# Altium footprint library mastermind.PCBLIB: 1061 footprints (part 46 of 67)
Each footprint in its own frame and in the unit in brackets; x right, y up, seen from the top. Pads: shape width x height; smd on the part's side, far side on the other; paste and mask are expansions set on the pad; w line width, h text height; cw(c..) or ccw(c..) is an arc to the next point about the centre after c.
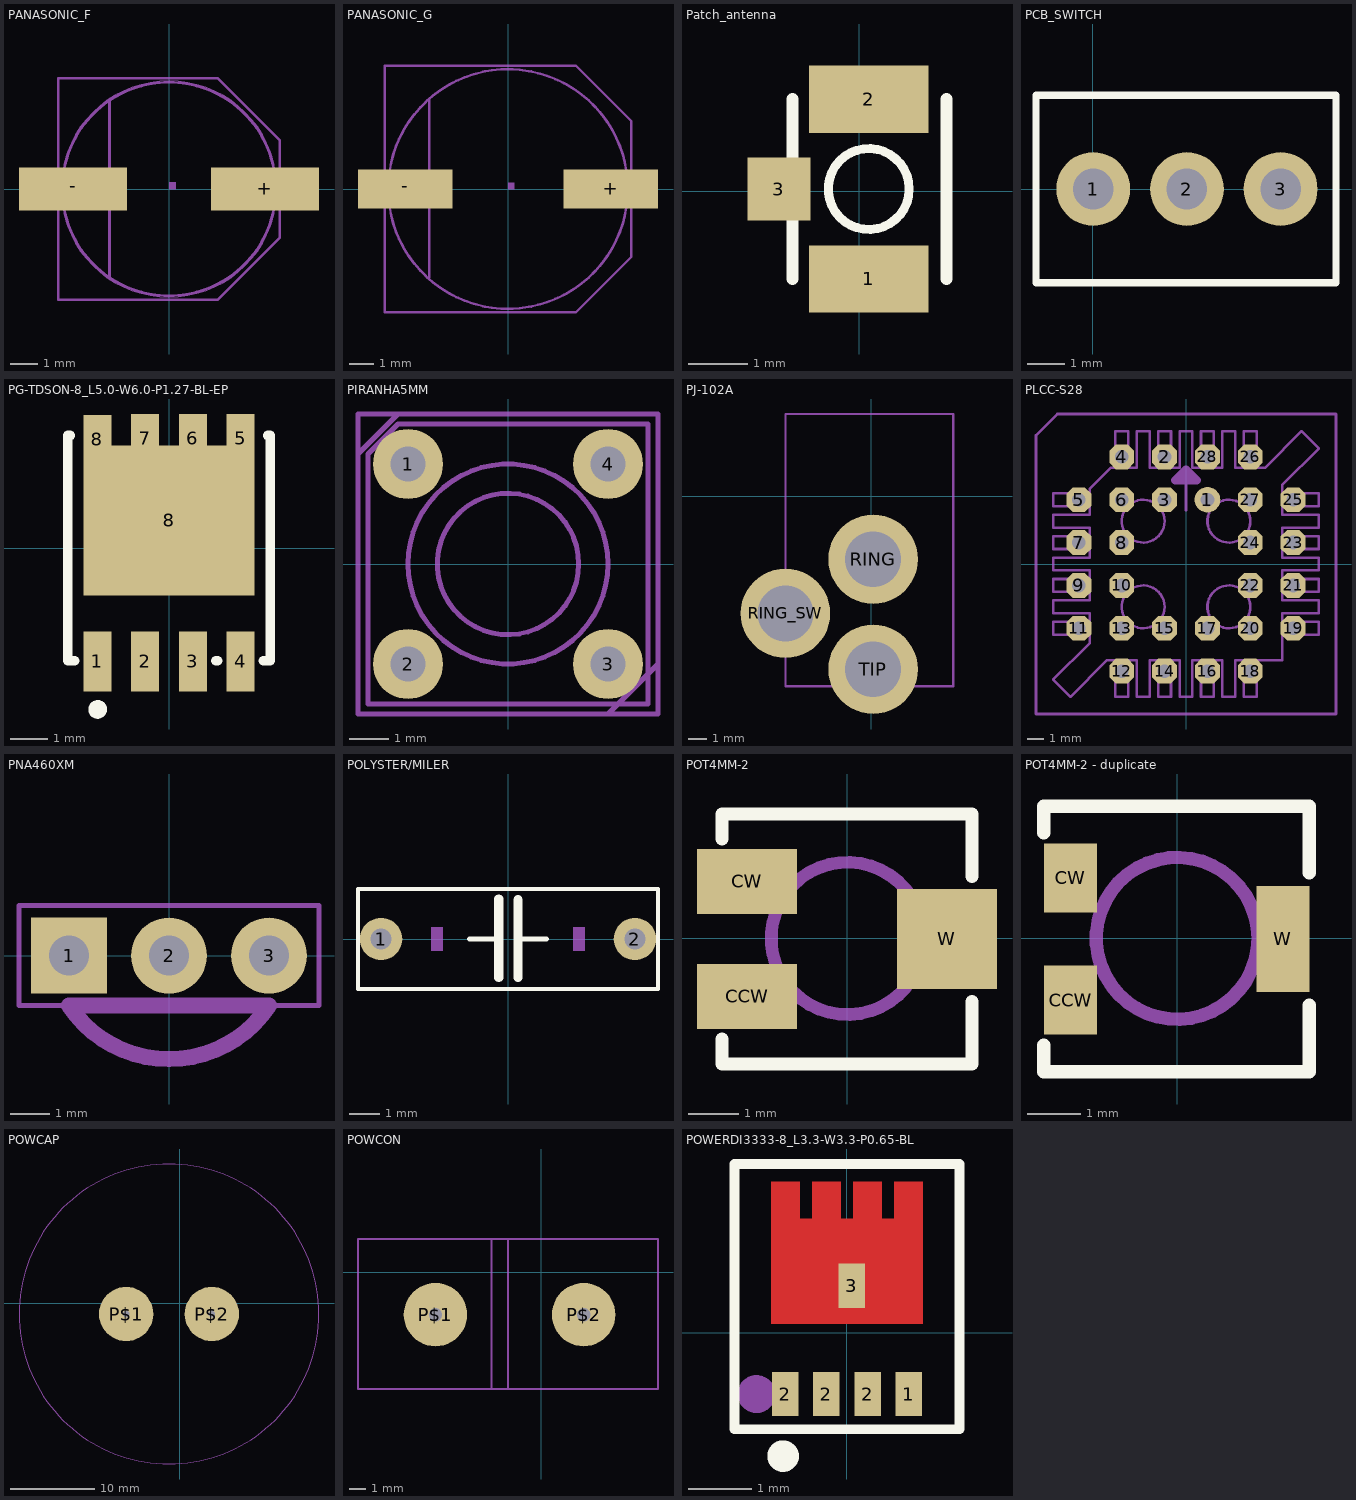
[diagram p45: the footprints below, top view; thin cyan lines are the x and y axes]

## PANASONIC_F [mm]
pads (2):
  rect 4x1.6 smd: +(3.55,0) -(-3.55,0)
Mechanical 2:
  lines w0.102: -4.1,-1 -4.1,-4.1 1.8,-4.1 4.1,-1.8 4.1,-1 ; -4.1,1 -4.1,4.1 1.8,4.1 4.1,1.8 4.1,1 ; -3.85,-0.9 ccw(c0,0) 3.85,-0.9 ; -3.85,0.9 cw(c0,0) 3.85,0.9
Mechanical 8:
  circle w0.102: c0,0 r3.95
  circle w0.001: c0,0 r4
  region: 0,0 0.254,0 0.254,0.254 0,0.254
  region: 3.9,-0.45 3.9,0.45 4.85,0.45 4.85,-0.45
  region: -4.85,-0.45 -4.85,0.45 -3.9,0.45 -3.9,-0.45
  lines w0.102: -2.2,-3.25 -2.2,3.25 ; -4.1,-4.1 -4.1,4.1 1.8,4.1 4.1,1.8 4.1,-1.8 1.8,-4.1 -4.1,-4.1

## PANASONIC_G [mm]
pads (2):
  rect 3.9x1.6 smd: +(4.25,0) -(-4.25,0)
Mechanical 2:
  lines w0.102: -5.1,-1 -5.1,-5.1 2.8,-5.1 5.1,-2.8 5.1,-1 ; -5.1,1 -5.1,5.1 2.8,5.1 5.1,2.8 5.1,1 ; -4.85,-1 ccw(c0,0) 4.85,-1 ; -4.85,1 cw(c0,0) 4.85,1
Mechanical 8:
  circle w0.102: c0,0 r4.95
  region: 0,0 0.254,0 0.254,0.254 0,0.254
  region: 4.9,-0.45 4.9,0.45 5.85,0.45 5.85,-0.45
  region: -5.85,-0.45 -5.85,0.45 -4.9,0.45 -4.9,-0.45
  lines w0.102: -3.25,-3.65 -3.25,3.7 ; -5.1,-5.1 -5.1,5.1 2.8,5.1 5.1,2.8 5.1,-2.8 2.8,-5.1 -5.1,-5.1

## Patch_antenna [mil]
pads (3):
  rect 80x45 smd: 1(6.5,-58.5) 2(6.5,61.5)
  rect 42x42 smd: 3(-53.5,1.5)
Top Overlay:
  circle w6: c6.5,1.5 r27
  lines w8: -44.5,-58.5 -44.5,61.5 ; 58.5,-58.5 58.5,61.5
3D body "I-PEX MHF_7 Recepticle.STEP": height 20.87, standoff -0.39, extent -35.22,-37.88 47.45,40.86

## PCB_SWITCH [mm]
pads (3):
  round 2 hole 1.1: 1(0.011,0.005) 2(2.551,0.005) 3(5.091,0.005)
Top Overlay:
  lines w0.2: -1.539,-2.535 6.591,-2.535 6.591,2.545 -1.539,2.545 -1.539,-2.535
3D body: height 5.08, standoff 0, extent -1.524,-2.54 6.604,2.54
3D body: height 15, standoff 0, extent 1.822,-0.718 3.258,0.718
3D body: height 8, standoff 0, extent 0.269,-2.271 4.811,2.271

## PCBComponent_1 - duplicate3 [mm]

## PG-TDSON-8_L5.0-W6.0-P1.27-BL-EP [mil]
pads (9):
  rect 29.5x62.99 smd paste-3937.01 mask+2: 1(-75,-118.87) 2(-25,-118.87) 3(25,-118.87) 4(75,-118.87)
  rect 29.5x51.2 smd paste-3937.01 mask+2: 5(75,114.94) 6(25,114.94) 7(-25,114.94) 8(-75,113.94)
  rect 179.53x157.48 smd paste-3937.01 mask+2: 8(0,29)
Top Overlay:
  circle w10: c-74.8,-169.28 r4.8
  lines w10: -103.6,118 -106,118 -106,-118 -98.85,-118 ; 48.85,-118 51.15,-118 ; 98.85,-118 106,-118 106,118 103.6,118
Top Paste:
  region: -39.75,-85.4 -39.75,-136.6 -10.25,-136.6 -10.25,-85.4
  region: 10.25,-85.4 10.25,-136.6 39.75,-136.6 39.75,-85.4
  region: -60.25,-136.6 -60.25,-85.4 -89.75,-85.4 -89.75,-136.6
  region: 60.25,-85.4 60.25,-136.6 89.75,-136.6 89.75,-85.4
  region: 39.75,107.74 39.75,136.6 10.25,136.6 10.25,107.74 -10.25,107.74 -10.25,136.6 -39.75,136.6 -39.75,107.74 -60.25,107.74 -60.25,135.6 -89.75,135.6 -89.75,107.74 -89.76,107.74 -89.76,-49.74 89.76,-49.74 89.76,107.74 89.75,107.74 89.75,136.6 60.25,136.6 60.25,107.74
Mechanical 15:
  circle w11.81: c-75,-130 r5.91

## PIRANHA5MM [mil]
pads (4):
  round 70 hole 35.43: 1(-100,100) 2(-100,-100) 3(100,-100) 4(100,100)
Mechanical 2:
  circle w5: c0,0 r100
  lines w5: -150,-150 150,-150 150,150 -110,150 -150,110 -150,-150
Mechanical 3:
  circle w5: c0,0 r70.71
  lines w5: -150,-150 100,-150 150,-100 150,150 -150,150 -150,-150
Mechanical 6:
  lines w5: -140,-140 140,-140 140,140 -110,140 -140,110 -140,-140

## PJ-102A [mm]
pads (3):
  round 4.8 hole 3: RING(0.1,-3.39) RING_SW(-4.6,-6.29) TIP(0.1,-9.29)
Mechanical 2:
  lines w0.127: -4.6,-10.2 4.4,-10.2 4.4,4.4 -4.6,4.4 -4.6,-10.2

## PLCC-S28 [mil]
pads (28):
  round 60 hole 32: 1(50,150)
  oct 58.09x58.09 hole 32: 2(-50,250) 3(-50,150) 4(-150,250) 5(-250,150) 6(-150,150) 7(-250,50) 8(-150,50) 9(-250,-50) 10(-150,-50) 11(-250,-150) 12(-150,-250) 13(-150,-150) 14(-50,-250) 15(-50,-150) 16(50,-250) 17(50,-150) 18(150,-250) 19(250,-150) 20(150,-150) 21(250,-50) 22(150,-50) 23(250,50) 24(150,50) 25(250,150) 26(150,250) 27(150,150) 28(50,250)
Mechanical 2:
  lines w6: -225,-185 -310,-270 -270,-310 -185,-225 ; -225,-115 -310,-115 -310,-85 -225,-85 ; -225,-15 -310,-15 -310,15 -225,15 ; -225,85 -310,85 -310,115 -225,115 ; -225,175 -175,225 ; -115,-225 -115,-310 -85,-310 -85,-225 ; -115,225 -115,310 -85,310 -85,225 ; -15,-225 -15,-310 15,-310 15,-225 ; -15,225 -15,310 15,310 15,225 ; 0,125 0,220 ; 85,-225 85,-310 115,-310 115,-225 ; 85,225 85,310 115,310 115,225 ; 165,-225 225,-225 225,-165 ; 185,225 270,310 310,270 225,185 ; 225,-115 310,-115 310,-85 225,-85 ; 225,-15 310,-15 310,15 225,15 ; 225,85 310,85 310,115 225,115 ; -350,-350 350,-350 350,350 -300,350 -350,300 -350,-350
  lines w20: -25,195 0,220 25,195 -25,195
Mechanical 8:
  circle w6: c100,-100 r50
  circle w6: c-100,-100 r50
  circle w6: c100,100 r50
  circle w6: c-100,100 r50
  lines w6: -225,-185 -225,-165 -310,-165 -310,-135 -225,-135 -225,-115 ; -225,-85 -225,-65 -310,-65 -310,-35 -225,-35 -225,-15 ; -225,15 -225,35 -310,35 -310,65 -225,65 -225,85 ; -225,115 -225,135 -310,135 -310,165 -225,165 -225,175 ; -185,-225 -165,-225 -165,-310 -135,-310 -135,-225 -115,-225 ; -175,225 -165,225 -165,310 -135,310 -135,225 -115,225 ; -85,-225 -65,-225 -65,-310 -35,-310 -35,-225 -15,-225 ; -85,225 -65,225 -65,310 -35,310 -35,225 -15,225 ; 15,-225 35,-225 35,-310 65,-310 65,-225 85,-225 ; 15,225 35,225 35,310 65,310 65,225 85,225 ; 115,-225 135,-225 135,-310 165,-310 165,-225 ; 115,225 135,225 135,310 165,310 165,225 185,225 ; 225,-165 310,-165 310,-135 225,-135 225,-115 ; 225,-85 225,-65 310,-65 310,-35 225,-35 225,-15 ; 225,15 225,35 310,35 310,65 225,65 225,85 ; 225,115 225,135 310,135 310,165 225,165 225,185

## PNA460XM [mil]
pads (3):
  rect 76x76 hole 40: 1(-100,0)
  round 76 hole 40: 2(0,0) 3(100,0)
Mechanical 2:
  lines w5: -100,-50 -150,-50 -150,50 150,50 150,-50 100,-50
  lines w16: -100,-50 ccw(c0,16.66) 100,-50 -100,-50
Mechanical 8:
  region: -110,-10 -110,10 -90,10 -90,-10
  region: -10,-10 -10,10 10,10 10,-10
  region: 90,-10 90,10 110,10 110,-10

## POLYSTER/MILER [mm]
pads (2):
  round 1.4 hole 0.7: 1(-4.191,0) 2(4.191,0)
Top Overlay:
  lines w0.127: -4.953,-1.651 -4.953,1.651 4.953,1.651 4.953,-1.651 -4.953,-1.651
  lines w0.152: -1.27,0 -0.305,0 ; 0.33,0 1.27,0
  lines w0.305: -0.305,-1.27 -0.305,0 -0.305,1.321 ; 0.33,-1.27 0.33,0 0.33,1.295
Mechanical 8:
  region: -2.54,-0.381 -2.54,0.381 -2.159,0.381 -2.159,-0.381
  region: 2.159,-0.381 2.159,0.381 2.54,0.381 2.54,-0.381
3D body "User Library-Film Capacitor 6x8mm (1)1.STEP": height 13.72, standoff -2.26, extent -3.772,-1.651 3.772,1.349

## POT4MM-2 [mm]
pads (3):
  rect 2x1.3 smd: CCW(-2.008,-1.162) CW(-2.008,1.138)
  rect 2x2 smd: W(1.992,-0.012)
Top Overlay:
  lines w0.254: -2.508,-2.012 -2.508,-2.512 2.492,-2.512 2.492,-1.262 ; -2.508,1.988 -2.508,2.488 2.492,2.488 2.492,1.238
Mechanical 2:
  circle w0.254: c0,0 r1.524
3D body: height 3.05, standoff 0, extent -1.519,0.132 1.519,1.525
3D body: height 3.05, standoff 0, extent -1.519,-1.525 1.519,-0.132
3D body: height 0.64, standoff 0, extent 1.143,-0.889 2.921,0.889
3D body: height 0.64, standoff 0, extent -2.921,-1.651 -1.143,-0.635
3D body: height 0.64, standoff 0, extent -2.921,0.635 -1.143,1.651
3D body: height 2.54, standoff 0, extent -2.54,-2.413 2.54,2.413
3D body: height 2.67, standoff 0, extent -1.436,-1.436 1.436,1.436

## POT4MM-2 - duplicate [mm]
pads (3):
  rect 1x1.3 smd: CCW(-2.008,-1.162) CW(-2.008,1.138)
  rect 1x2 smd: W(1.992,-0.012)
Top Overlay:
  lines w0.254: -2.508,-2.012 -2.508,-2.512 2.492,-2.512 2.492,-1.262 ; -2.508,1.988 -2.508,2.488 2.492,2.488 2.492,1.238
Mechanical 2:
  circle w0.254: c0,0 r1.524
3D body "35WR10KLFTR--3DModel-STEP-205271.STEP": height 1.57, standoff -0.01, extent -1.882,-1.573 1.574,1.46

## POWCAP [mil]
pads (2):
  round 254 hole 31.5: P$1(-250,-50) P$2(150,-50)
Mechanical 2:
  circle w5: c-50,-50 r700

## POWCON [mil]
pads (2):
  round 150 hole 31.5: P$1(-250,-100) P$2(100,-100)
Mechanical 2:
  lines w5: -118.11,-275.59 -78.74,-275.59 ; -118.11,-275.59 -118.11,78.74 ; -118.11,-275.59 -433.07,-275.59 -433.07,78.74 -118.11,78.74 ; -118.11,78.74 -78.74,78.74 ; -78.74,-275.59 -78.74,78.74 ; -78.74,-275.59 275.59,-275.59 275.59,78.74 -78.74,78.74

## POWERDI3333-8_L3.3-W3.3-P0.65-BL [mm]
pads (5):
  rect 0.42x0.7 smd: 1(0.975,-0.97) 2(-0.975,-0.97) 2(-0.325,-0.97) 2(0.325,-0.97) 3(0.076,0.742)
Top Layer:
  region: -1.2,0.14 -1.2,2.39 -0.75,2.39 -0.75,1.8 -0.55,1.8 -0.55,2.39 -0.1,2.39 -0.1,1.8 0.1,1.8 0.1,2.39 0.55,2.39 0.55,1.8 0.75,1.8 0.75,2.39 1.2,2.39 1.2,0.14
Top Overlay:
  circle w0.25: c-1.01,-1.95 r0.125
  lines w0.152: -1.778,-1.524 -1.778,2.667 1.778,2.667 1.778,-1.524 -1.778,-1.524
Top Paste:
  region: -1.2,0.14 -1.2,2.39 -0.75,2.39 -0.75,1.8 -0.55,1.8 -0.55,2.39 -0.1,2.39 -0.1,1.8 0.1,1.8 0.1,2.39 0.55,2.39 0.55,1.8 0.75,1.8 0.75,2.39 1.2,2.39 1.2,0.14
  region: 1.2,2.39 1.2,0.14 -1.2,0.14 -1.2,2.39 -0.75,2.39 -0.75,1.8 -0.55,1.8 -0.55,2.39 -0.1,2.39 -0.1,1.8 0.1,1.8 0.1,2.39 0.55,2.39 0.55,1.8 0.75,1.8 0.75,2.39
  region: 0.76,-0.62 1.19,-0.62 1.19,-1.32 0.76,-1.32
  region: 0.11,-0.62 0.54,-0.62 0.54,-1.32 0.11,-1.32
  region: -0.54,-0.62 -0.11,-0.62 -0.11,-1.32 -0.54,-1.32
  region: -1.19,-0.62 -0.76,-0.62 -0.76,-1.32 -1.19,-1.32
Top Solder:
  region: -1.2,0.14 -1.2,2.39 -0.75,2.39 -0.75,1.8 -0.55,1.8 -0.55,2.39 -0.1,2.39 -0.1,1.8 0.1,1.8 0.1,2.39 0.55,2.39 0.55,1.8 0.75,1.8 0.75,2.39 1.2,2.39 1.2,0.14
Mechanical 2:
  text "dfn-8" at -0.046,-4.646 h1.52
Mechanical 15:
  circle w0.3: c-1.43,-0.97 r0.15
3D body: height 0.7, standoff 0, extent -1.43,-0.97 1.47,2.095